# Altium footprint library OSHW_LuxonisMaster_20201223.PcbLib: 112 footprints (part 1 of 7)
Each footprint in its own frame and in the unit in brackets; x right, y up, seen from the top. Pads: shape width x height; smd on the part's side, far side on the other; paste and mask are expansions set on the pad; w line width, h text height; cw(c..) or ccw(c..) is an arc to the next point about the centre after c.
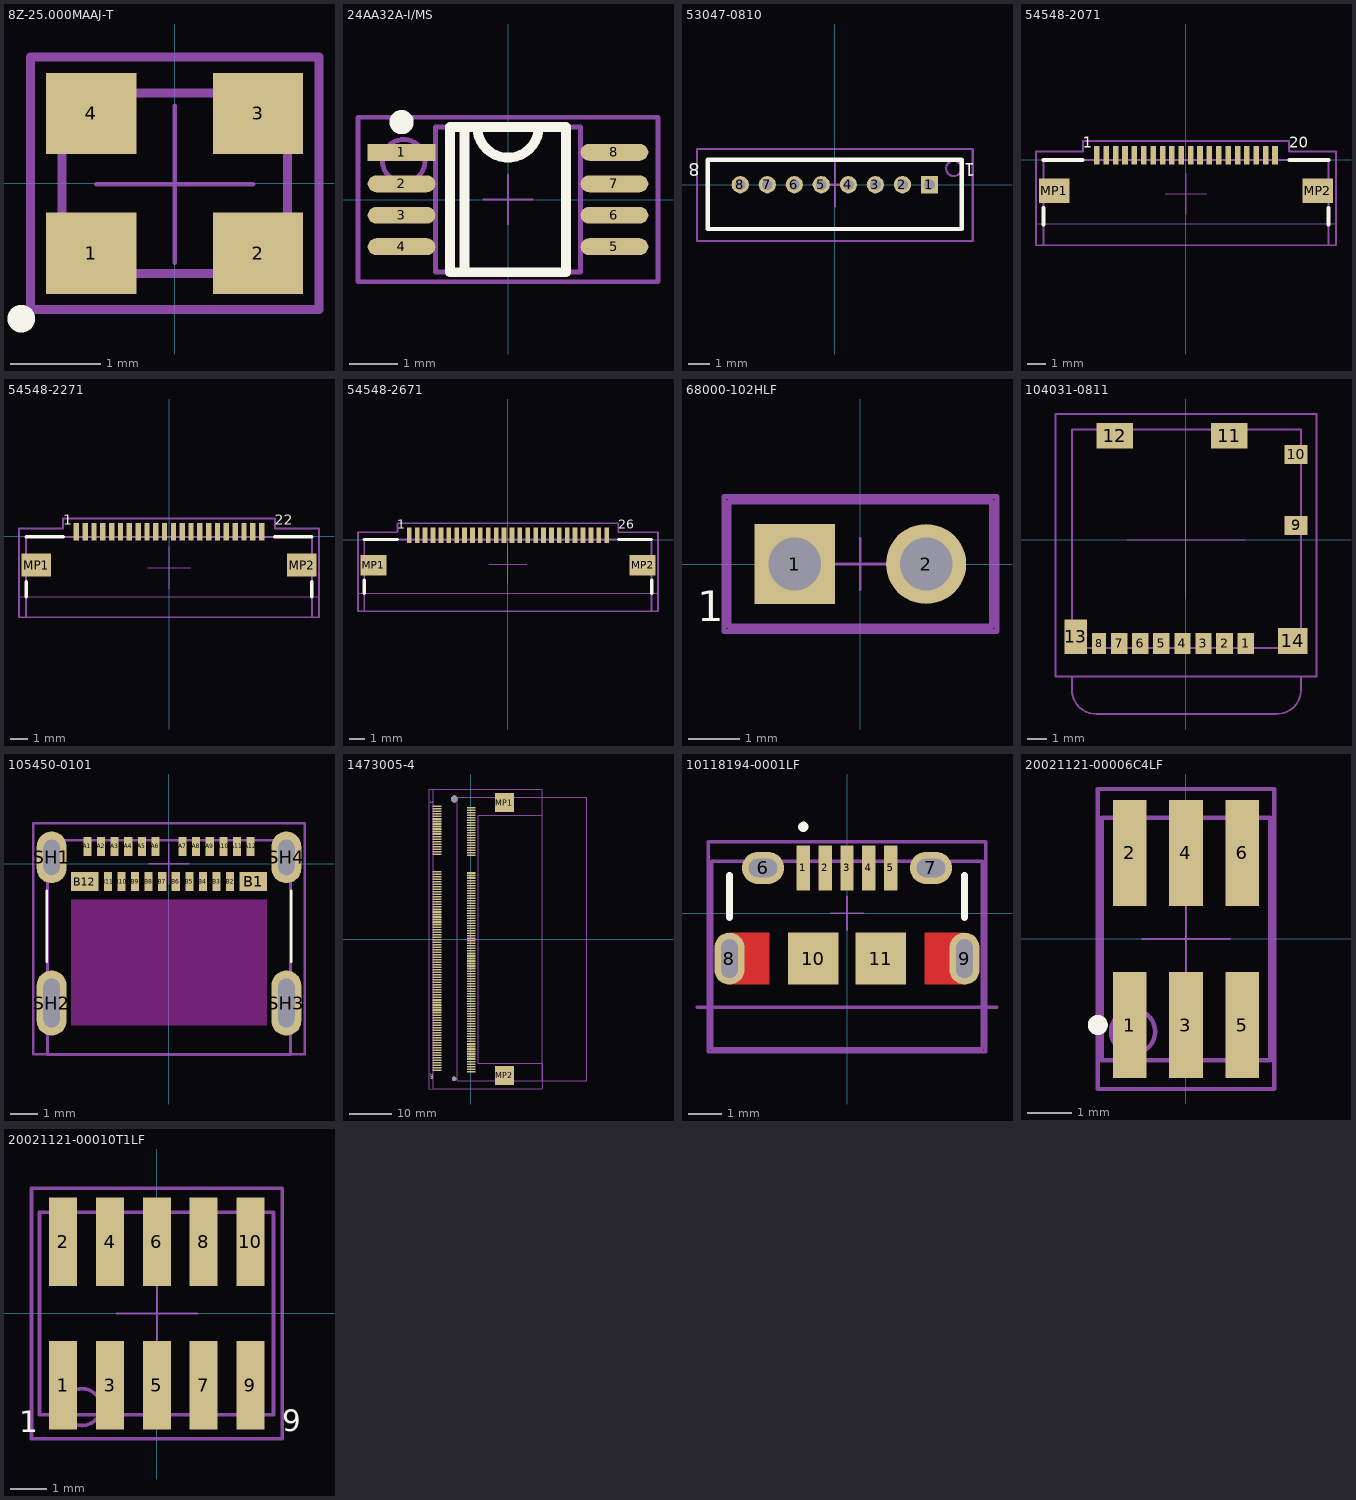
[diagram p0: the footprints below, top view; thin cyan lines are the x and y axes]

## 8Z-25.000MAAJ-T [mm] "2.5 x 2.0 x 0.5mm 8Z series XTAL"
height 0.55
pads (4):
  rect 1x0.9 smd: 1(-0.925,-0.775) 2(0.925,-0.775) 3(0.925,0.775) 4(-0.925,0.775)
Top Overlay:
  circle w0.254: c-1.7,-1.5 r0.025
Top Assembly:
  lines w0.1: -1.6,-1.4 1.6,-1.4 1.6,1.4 -1.6,1.4 -1.6,-1.4
  text "'.Designator'" at 0,-0.011 h1
Top Courtyard:
  lines w0.05: -0.87,-0.011 0,-0.011 ; 0,-0.881 0,-0.011 ; 0,0.859 0,-0.011 ; 0.87,-0.011 0,-0.011 ; -1.6,-1.4 1.6,-1.4 1.6,1.4 -1.6,1.4 -1.6,-1.4
Top Component Outline:
  lines w0.1: -1.25,-1 -1.25,1 1.25,1 1.25,-1 -1.25,-1
3D body: height 0.55, standoff 0, extent -1.25,-1 1.25,1

## 24AA32A-I/MS [mm] "Body: 3 x 3mm, pitch: 0.65mm"
pads (8):
  rect 1.4x0.35 smd mask+0.05: 1(-2.2,0.975)
  oval 1.4x0.35 smd mask+0.05: 2(-2.2,0.325) 3(-2.2,-0.325) 4(-2.2,-0.975) 5(2.2,-0.975) 6(2.2,-0.325) 7(2.2,0.325) 8(2.2,0.975)
Top Overlay:
  circle w0.25: c-2.2,1.6 r0.125
  lines w0.2: -0.9,-1.5 -0.9,1.5 ; -0.635,1.5 ccw(c0,1.5) 0.635,1.5 ; -1.2,-1.5 -1.2,1.5 1.2,1.5 1.2,-1.5 -1.2,-1.5
Top Assembly:
  circle w0.1: c-2.154,0.8 r0.441
  lines w0.1: -3.1,-1.7 -3.1,1.7 -1.7,1.7 1.7,1.7 3.1,1.7 3.1,-1.7 1.7,-1.7 -1.7,-1.7 -3.1,-1.7
  text "'.Designator'" at 0,0 h1
Top Courtyard:
  lines w0.05: -0.5,0 0.5,0 ; 0,-0.5 0,0.5 ; -3.1,-1.7 -3.1,1.7 -1.7,1.7 1.7,1.7 3.1,1.7 3.1,-1.7 1.7,-1.7 -1.7,-1.7 -3.1,-1.7
Top Component Outline:
  lines w0.1: -1.5,-1.5 -1.5,1.5 1.5,1.5 1.5,-1.5 -1.5,-1.5
3D body "User Library-msop-8.step": height 1.15, standoff 0, extent -2.45,-1.5 2.45,1.5

## 15134-0802 [mm] "Cable Assembly, Single Row, 150.00mm Length, 8 Circuits"
height 5.2

## 53047-0810 [mm] "1.25mm Pitch, PicoBlade PCB Header, Single Row, Vertical, Through Hole, Tin Plating, Friction Lock, 8 Circuits"
height 0.132
pads (8):
  rect 0.8x0.8 hole 0.5: 1(4.375,0)
  round 0.8 hole 0.5: 2(3.125,0) 3(1.875,0) 4(0.625,0) 5(-0.625,0) 6(-1.875,0) 7(-3.125,0) 8(-4.375,0)
Top Overlay:
  lines w0.2: 5.875,1.15 5.875,-2.05 -5.875,-2.05 -5.875,1.15 5.875,1.15 ; 5.875,1.15 5.875,1.15
  text "8" at -6.25,1.2 h1
  text "1" at 6.5,1.2 h1
Top Assembly:
  circle w0.1: c5.5,0.75 r0.354
  lines w0.1: -6.375,-2.6 -6.375,1.65 6.375,1.65 6.375,-2.6 -6.375,-2.6
  text "'.Designator'" at 0,0 h1
Top Courtyard:
  lines w0.05: -6.375,-2.6 6.375,-2.6 6.375,1.65 -6.375,1.65 -6.375,-2.6
  lines w0.1: -1,0 0,0 ; 0,-1 0,0 ; 0,1 0,0 ; 1,0 0,0
Top Component Outline:
  lines w0.1: -5.875,-2.05 -5.875,1.15 5.875,1.15 5.875,-2.05 -5.875,-2.05
3D body "PicoBladePTH_8p_Header_530470810.stp": height 4.18, standoff -2.32, extent -5.875,-2.05 5.875,1.15

## 54548-2071 [mm] "20pin Molex FFC 0.5mm"
height 1.3
pads (22):
  rect 0.3x1 smd: 1(-4.75,0.25) 2(-4.25,0.25) 3(-3.75,0.25) 4(-3.25,0.25) 5(-2.75,0.25) 6(-2.25,0.25) 7(-1.75,0.25) 8(-1.25,0.25) 9(-0.75,0.25) 10(-0.25,0.25) 11(0.25,0.25) 12(0.75,0.25) 13(1.25,0.25) 14(1.75,0.25) 15(2.25,0.25) 16(2.75,0.25) 17(3.25,0.25) 18(3.75,0.25) 19(4.25,0.25) 20(4.75,0.25)
  rect 1.65x1.3 smd: MP1(-7.025,-1.65) MP2(7.025,-1.65)
Top Overlay:
  lines w0.2: -7.6,-3.45 -7.6,-2.562 ; -7.6,0 -5.5,0 ; 5.5,0 7.6,0 ; 7.6,-3.45 7.6,-2.562
  text "20" at 5.5,0.45 h1
  text "1" at -5.5,0.45 h1
Top Assembly:
  lines w0.1: 8,-1.55 8,0.45 5.5,0.45 5.5,1 -5.5,1 -5.5,0.45 -8,0.45 -8,-2.3 -8,-4.55 8,-4.55 ; 8,-1 8,-4.55 ; 8,-4.55 8,-4.55
  text "'.Designator'" at 0,0 h1
Top Courtyard:
  lines w0.05: -8,-3.4 8,-3.4 ; -1.1,-1.8 0,-1.8 ; 0,-2.9 0,-1.8 ; 0,-0.7 0,-1.8 ; 1.1,-1.8 0,-1.8 ; 8,-1.55 8,0.45 5.5,0.45 5.5,1 -5.5,1 -5.5,0.45 -8,0.45 -8,-2.3 -8,-4.55 8,-4.55 8,-1
Top Component Outline:
  lines w0.1: -7.6,-4.55 -7.6,0 7.6,0 7.6,-4.55 -7.6,-4.55
3D body "545482071.stp": height 1.18, standoff -0.02, extent -7.6,-4.55 7.6,0.45

## 54548-2271 [mm] "22pin Molex FFC 0.5mm"
height 1.3
pads (24):
  rect 0.3x1 smd: 1(-5.25,0.269) 2(-4.75,0.269) 3(-4.25,0.269) 4(-3.75,0.269) 5(-3.25,0.269) 6(-2.75,0.269) 7(-2.25,0.269) 8(-1.75,0.269) 9(-1.25,0.269) 10(-0.75,0.269) 11(-0.25,0.269) 12(0.25,0.269) 13(0.75,0.269) 14(1.25,0.269) 15(1.75,0.269) 16(2.25,0.269) 17(2.75,0.269) 18(3.25,0.269) 19(3.75,0.269) 20(4.25,0.269) 21(4.75,0.269) 22(5.25,0.269)
  rect 1.65x1.3 smd: MP1(-7.525,-1.631) MP2(7.525,-1.631)
Top Overlay:
  lines w0.2: -8.1,-3.431 -8.1,-2.571 ; -8.1,-0.031 -6,-0.031 ; 6,-0.031 8.1,-0.031 ; 8.1,-3.431 8.1,-2.571
  text "1" at -6,0.45 h1
  text "22" at 6,0.45 h1
Top Assembly:
  lines w0.1: -8.5,-4.581 -8.5,0.45 -6,0.45 -6,1.019 6,1.019 6,0.45 8.5,0.45 8.5,-4.581 -8.5,-4.581
  text "'.Designator'" at 0,-0.031 h1
Top Courtyard:
  lines w0.05: -8.5,-3.431 8.5,-3.431 ; -1.2,-1.781 0,-1.781 ; 0,-2.981 0,-1.781 ; 0,-0.581 0,-1.781 ; 1.2,-1.781 0,-1.781 ; -8.5,-4.581 -8.5,0.45 -6,0.45 -6,1.019 6,1.019 6,0.45 8.5,0.45 8.5,-4.581 -8.5,-4.581
Top Component Outline:
  lines w0.1: -8.1,-4.581 -8.1,-0.031 8.1,-0.031 8.1,-4.581 -8.1,-4.581
3D body "54548-2271.stp": height 1.18, standoff -0.02, extent -8.1,-4.55 8.1,0.45

## 54548-2671 [mm] "26pin Molex FFC 0.5mm"
height 1.3
pads (28):
  rect 0.3x1 smd: 1(-6.241,0.272) 2(-5.741,0.272) 3(-5.241,0.272) 4(-4.741,0.272) 5(-4.241,0.272) 6(-3.741,0.272) 7(-3.241,0.272) 8(-2.741,0.272) 9(-2.241,0.272) 10(-1.741,0.272) 11(-1.241,0.272) 12(-0.741,0.272) 13(-0.241,0.272) 14(0.259,0.272) 15(0.759,0.272) 16(1.259,0.272) 17(1.759,0.272) 18(2.259,0.272) 19(2.759,0.272) 20(3.259,0.272) 21(3.759,0.272) 22(4.259,0.272) 23(4.759,0.272) 24(5.259,0.272) 25(5.759,0.272) 26(6.259,0.272)
  rect 1.65x1.3 smd: MP1(-8.516,-1.628) MP2(8.534,-1.628)
Top Overlay:
  lines w0.2: -9.091,-3.428 -9.091,-2.568 ; -9.091,0 -6.991,0 ; 6.998,0 9.098,0 ; 9.109,-3.428 9.109,-2.568
  text "1" at -6.991,0.45 h1
  text "26" at 6.998,0.45 h1
Top Assembly:
  lines w0.1: -9.491,-4.55 -9.491,0.45 -6.991,0.45 -6.991,1.022 6.998,1.022 6.998,0.45 9.509,0.45 9.509,-4.55 -9.491,-4.55
  text "'.Designator'" at 0.003,0 h1
Top Courtyard:
  lines w0.05: -9.491,-3.4 9.509,-3.4 ; -1.2,-1.578 0,-1.578 ; 0,-2.778 0,-1.578 ; 0,-0.378 0,-1.578 ; 1.2,-1.578 0,-1.578 ; -9.491,-4.55 -9.1,-4.55 9.509,-4.55 9.509,0.45 6.998,0.45 6.998,1.022 -6.991,1.022 -6.991,0.45 -9.491,0.45 -9.491,-4.34 -9.491,-4.55
Top Component Outline:
  lines w0.1: -9.1,-4.55 9.1,-4.55 9.098,-4.55 9.098,0 -9.092,0 -9.1,0 -9.1,-4.55
3D body "545482671.stp": height 1.18, standoff -0.02, extent -9.1,-4.55 9.1,0.45

## 68000-102HLF [mm] "THD, 2-Leads, Body 5.08x2.41mm, Pitch 2.54mm"
height 8.38
pads (2):
  rect 1.55x1.55 hole 1.02: 1(-1.27,0)
  round 1.55 hole 1.02: 2(1.27,0)
Top Overlay:
  text "1" at -3.16,-1.3 h1
Top Assembly:
  lines w0.1: -2.64,-1.305 2.64,-1.305 2.64,1.305 -2.64,1.305 -2.64,-1.305
  text "'.Designator'" at 0,0 h1
Top Courtyard:
  lines w0.05: -0.5,0 0.5,0 ; 0,-0.5 0,0.5 ; -2.64,-1.305 -2.64,1.305 2.64,1.305 2.64,-1.305 -2.64,-1.305
Top Component Outline:
  lines w0.1: -2.54,-1.205 2.54,-1.205 2.54,1.205 -2.54,1.205 -2.54,-1.205
3D body: height 2.54, standoff 0.2, extent -2.54,-1.205 2.54,1.205
3D body: height 8.38, standoff -2.41, extent -1.59,-0.32 -0.95,0.32
3D body: height 8.38, standoff -2.41, extent 0.95,-0.32 1.59,0.32

## 90592A006 [mm] "Steel Hex Nut  Low-Strength, M2.5 x 0.45 mm Thread"
height 2.35
3D body "90592A006_NO THREADS_STEEL HEX NUT.STEP": height 2.35, standoff -0.03, extent -2.5,-2.887 2.5,2.887

## 92000A102 [mm] "Passivated 18-8 Stainless Steel Pan Head Phillips Screws  M2.5 x 0.45mm Thread, 4mm Long"
height 6.1
3D body "92000A102_18-8 SS METRIC PAN HEAD PHIL MACHINE SCREW.STEP": height 2.03, standoff -4, extent -2.5,-2.5 2.5,2.5

## 104031-0811 [mm] "10 (8 + 2) Position Card Connector Secure Digital - microSD™ Surface Mount, Right Angle Gold"
height 1.42
pads (14):
  rect 0.85x1.1 smd: 1(3.113,-5.412) 3(0.913,-5.412) 4(-0.188,-5.412) 5(-1.288,-5.412) 6(-2.387,-5.412) 7(-3.487,-5.412)
  rect 0.875x1.1 smd: 2(2.013,-5.412)
  rect 0.75x1.1 smd: 8(-4.537,-5.412)
  rect 1.2x1 smd: 9(5.748,0.738) 10(5.748,4.438)
  rect 1.9x1.35 smd: 11(2.248,5.413) 12(-3.722,5.413)
  rect 1.17x1.8 smd: 13(-5.747,-5.062)
  rect 1.55x1.35 smd: 14(5.573,-5.287)
Top Assembly:
  lines w0.1: -5.95,-7.15 -5.95,-7.83 ccw(c-4.68,-7.83) -4.68,-9.1 -3.7,-9.1 4.73,-9.1 ccw(c4.73,-7.83) 6,-7.83 6,-7.15 ; -5.95,-7.15 -6.8,-7.15 -6.8,-6.75 -6.8,6.55 4.1,6.55 6.8,6.55 6.8,-5.412 6.8,-7.15 6,-7.15 ; -5.95,-7.15 6,-7.15
  text "'.Designator'" at 0,0 h1
Top Courtyard:
  lines w0.05: -3.1,0 0,0 ; 0,-3.1 0,0 ; 0,3.1 0,0 ; 3.1,0 0,0 ; -6.8,-7.15 -6.8,6.55 6.8,6.55 6.8,-7.15 -6.8,-7.15
Top Component Outline:
  lines w0.1: -5.95,-5.65 6,-5.65 6,5.75 -5.95,5.75 -5.95,-5.65
3D body "1040310811.stp": height 1.44, standoff -0.01, extent -5.95,-5.65 6,5.75

## 105450-0101 [mm] "USB3.1 Type-C Molex SMT, RA, TH"
pads (28):
  rect 0.3x0.7 smd mask+0.05: A1(-3,0.65) A2(-2.5,0.65) A3(-2,0.65) A4(-1.5,0.65) A5(-1,0.65) A6(-0.5,0.65) A7(0.5,0.65) A8(1,0.65) A9(1.5,0.65) A10(2,0.65) A11(2.5,0.65) A12(3,0.65) B2(2.25,-0.65) B3(1.75,-0.65) B4(1.25,-0.65) B5(0.75,-0.65) B6(0.25,-0.65) B7(-0.25,-0.65) B8(-0.75,-0.65) B9(-1.25,-0.65) B10(-1.75,-0.65) B11(-2.25,-0.65)
  rect 1x0.7 smd mask+0.05: B1(3.1,-0.65) B12(-3.1,-0.65)
  oval 1.1x1.9 hole 0.6 slot 1.3 at 90 deg mask+0.05: SH1(-4.32,0.24) SH4(4.32,0.24)
  oval 1.1x2.4 hole 0.6 slot 1.8 at 90 deg mask+0.05: SH2(-4.32,-5.12) SH3(4.32,-5.12)
Top Layer keep-out:
  rectangle: -3.6,-5.95 3.6,-1.3
Top Overlay:
  lines w0.1: -4.5,-3.6 -4.5,-1 ; 4.5,-3.6 4.5,-1
Top Assembly:
  lines w0.1: -5,-7 5,-7 5,1.5 -5,1.5 -5,-7
  text "'.Designator'" at 0,0 h1
Top Courtyard:
  lines w0.05: -0.75,0 0,0 ; 0,-0.75 0,0 ; 0,0.75 0,0 ; 0.75,0 0,0 ; -5,-7 -5,1.5 5,1.5 5,-7 -5,-7
Top Component Outline:
  lines w0.1: -4.47,-7.025 4.47,-7.025 4.47,0.875 -4.47,0.875 -4.47,-7.025
3D body "1054500101.stp": height 3.2, standoff -0.76, extent -4.47,-7.025 4.47,0.875

## 1473005-4 [mm] "DDR2 SODIMM SOCKET 200P 5"
height 5.2
pads (204):
  rect 2.05x0.38 smd: 1(-8.05,31.65) 1(-8.05,31.65) 2(0.15,31.35) 2(0.15,31.35) 3(-8.05,31.05) 4(0.15,30.75) 5(-8.05,30.45) 6(0.15,30.15) 7(-8.05,29.85) 8(0.15,29.55) 9(-8.05,29.25) 10(0.15,28.95) 11(-8.05,28.65) 12(0.15,28.35) 13(-8.05,28.05) 14(0.15,27.75) 15(-8.05,27.45) 16(0.15,27.15) 17(-8.05,26.85) 18(0.15,26.55) 19(-8.05,26.25) 20(0.15,25.95) 21(-8.05,25.65) 22(0.15,25.35) 23(-8.05,25.05) 24(0.15,24.75) 25(-8.05,24.45) 26(0.15,24.15) 27(-8.05,23.85) 28(0.15,23.55) 29(-8.05,23.25) 30(0.15,22.95) 31(-8.05,22.65) 32(0.15,22.35) 33(-8.05,22.05) 34(0.15,21.75) 35(-8.05,21.45) 36(0.15,21.15) 37(-8.05,20.85) 38(0.15,20.55) 39(-8.05,20.25) 40(0.15,19.95) 41(-8.05,16.05) 42(0.15,15.75) 43(-8.05,15.45) 44(0.15,15.15) 45(-8.05,14.85) 46(0.15,14.55) 47(-8.05,14.25) 48(0.15,13.95) 49(-8.05,13.65) 50(0.15,13.35) 51(-8.05,13.05) 52(0.15,12.75) 53(-8.05,12.45) 54(0.15,12.15) 55(-8.05,11.85) 56(0.15,11.55) 57(-8.05,11.25) 58(0.15,10.95) 59(-8.05,10.65) 60(0.15,10.35) 61(-8.05,10.05) 62(0.15,9.75) 63(-8.05,9.45) 64(0.15,9.15) 65(-8.05,8.85) 66(0.15,8.55) 67(-8.05,8.25) 68(0.15,7.95) 69(-8.05,7.65) 70(0.15,7.35) 71(-8.05,7.05) 72(0.15,6.75) 73(-8.05,6.45) 74(0.15,6.15) 75(-8.05,5.85) 76(0.15,5.55) 77(-8.05,5.25) 78(0.15,4.95) 79(-8.05,4.65) 80(0.15,4.35) 81(-8.05,4.05) 82(0.15,3.75) 83(-8.05,3.45) 84(0.15,3.15) 85(-8.05,2.85) 86(0.15,2.55) 87(-8.05,2.25) 88(0.15,1.95) 89(-8.05,1.65) 90(0.15,1.35) 91(-8.05,1.05) 92(0.15,0.75) 93(-8.05,0.45) 94(0.15,0.15) 95(-8.05,-0.15) 96(0.15,-0.45) 97(-8.05,-0.75) 98(0.15,-1.05) 99(-8.05,-1.35) 100(0.15,-1.65) 101(-8.05,-1.95) 102(0.15,-2.25) 103(-8.05,-2.55) 104(0.15,-2.85) 105(-8.05,-3.15) 106(0.15,-3.45) 107(-8.05,-3.75) 108(0.15,-4.05) 109(-8.05,-4.35) 110(0.15,-4.65) 111(-8.05,-4.95) 112(0.15,-5.25) 113(-8.05,-5.55) 114(0.15,-5.85) 115(-8.05,-6.15) 116(0.15,-6.45) 117(-8.05,-6.75) 118(0.15,-7.05) 119(-8.05,-7.35) 120(0.15,-7.65) 121(-8.05,-7.95) 122(0.15,-8.25) 123(-8.05,-8.55) 124(0.15,-8.85) 125(-8.05,-9.15) 126(0.15,-9.45) 127(-8.05,-9.75) 128(0.15,-10.05) 129(-8.05,-10.35) 130(0.15,-10.65) 131(-8.05,-10.95) 132(0.15,-11.25) 133(-8.05,-11.55) 134(0.15,-11.85) 135(-8.05,-12.15) 136(0.15,-12.45) 137(-8.05,-12.75) 138(0.15,-13.05) 139(-8.05,-13.35) 140(0.15,-13.65) 141(-8.05,-13.95) 142(0.15,-14.25) 143(-8.05,-14.55) 144(0.15,-14.85) 145(-8.05,-15.15) 146(0.15,-15.45) 147(-8.05,-15.75) 148(0.15,-16.05) 149(-8.05,-16.35) 150(0.15,-16.65) 151(-8.05,-16.95) 152(0.15,-17.25) 153(-8.05,-17.55) 154(0.15,-17.85) 155(-8.05,-18.15) 156(0.15,-18.45) 157(-8.05,-18.75) 158(0.15,-19.05) 159(-8.05,-19.35) 160(0.15,-19.65) 161(-8.05,-19.95) 162(0.15,-20.25) 163(-8.05,-20.55) 164(0.15,-20.85) 165(-8.05,-21.15) 166(0.15,-21.45) 167(-8.05,-21.75) 168(0.15,-22.05) 169(-8.05,-22.35) 170(0.15,-22.65) 171(-8.05,-22.95) 172(0.15,-23.25) 173(-8.05,-23.55) 174(0.15,-23.85) 175(-8.05,-24.15) 176(0.15,-24.45) 177(-8.05,-24.75) 178(0.15,-25.05) 179(-8.05,-25.35) 180(0.15,-25.65) 181(-8.05,-25.95) 182(0.15,-26.25) 183(-8.05,-26.55) 184(0.15,-26.85) 185(-8.05,-27.15) 186(0.15,-27.45) 187(-8.05,-27.75) 188(0.15,-28.05) 189(-8.05,-28.35) 190(0.15,-28.65) 191(-8.05,-28.95) 192(0.15,-29.25) 193(-8.05,-29.55) 194(0.15,-29.85) 195(-8.05,-30.15) 196(0.15,-30.45) 197(-8.05,-30.75) 198(0.15,-31.05) 199(-8.05,-31.35) 200(0.15,-31.65)
  rect 4.6x4.5 smd: MP1(8.05,32.55) MP2(8.05,-32.55)
via -3.95,-33.4 diameter 1.1 hole 1.1
via -3.95,33.4 diameter 1.6 hole 1.6
Top Overlay:
  text "199" at -9.795,-32.092 h1
  text "1" at -9.812,32.884 h1
Board:
  region: -1.75,33.4
Top Assembly:
  lines w0.1: -9.95,35.8 -9.95,-35.8 17.1,-35.75 17.1,-33.8 ; -9.95,35.801 17.1,35.75 ; -8.95,35.75 17.1,35.75 ; 1.75,29.55 1.75,-29.6 17.1,-29.6 ; 1.75,29.55 1.75,29.55 ; 1.75,29.55 17.1,29.55 17.1,33.8 17.1,33.8 ; 17.1,-29.6 17.1,-29.6 17.1,-33.8 ; 17.1,-29.6 17.1,-29.6 ; 17.1,-33.8 27.75,-33.8 27.75,33.8 17.1,33.8 ; 17.1,33.8 17.1,35.75
  text "'.Designator'" at -0.032,-0.04 h1
Top Courtyard:
  lines w0.05: 0,-1.5 0,0 ; 0,1.6 0,0 ; 1.5,0 0,0 ; 17.1,-33.8 27.75,-33.8 27.75,33.8 17.1,33.8 ; 0,0 -1.6,0 0,0 ; -9.95,-35.801 17.1,-35.75 17.1,-29.6 1.75,-29.6 1.75,29.55 17.1,29.55 17.1,35.75 -9.95,35.801 -9.95,-35.801
  text "<1mm height" at 15.2,4.9 h1
Top Component Outline:
  lines w0.1: 17.1,-33.8 27.75,-33.8 27.75,33.8 17.1,33.8 ; 17.1,-33.8 17.1,33.8 ; 17.1,-33.8 -3.25,-33.8 -3.25,33.8 17.1,33.8 ; 17.1,-33.8 17.1,-35.75 -8.95,-35.75 -8.95,35.75 17.1,35.75 17.1,33.8
3D body "c-1473005-4-j1-3d.stp": height 5.2, standoff -0.7, extent -8.95,-35.75 17.1,35.75
3D body "Compute Module.stp": height 4.8, standoff 2.2, extent -3.25,-33.8 27.75,33.8

## 10118194-0001LF [mm] "FCI-10118194-0001LF-5_V SMD, 5-Leads, Body 7x5mm, Pitch 0.65 mm"
height 2.673
pads (11):
  rect 0.4x1.35 smd: 1(-1.3,1.35) 2(-0.65,1.35) 3(0,1.35) 4(0.65,1.35) 5(1.3,1.35)
  oval 1.25x0.95 hole 0.55 slot 0.85 at 0 deg: 6(-2.5,1.35) 7(2.5,1.35)
  oval 0.9x1.55 hole 0.5 slot 1.15 at 90 deg: 8(-3.5,-1.35) 9(3.5,-1.35)
  rect 1.5x1.55 smd: 10(-1,-1.35) 11(1,-1.35)
Top Layer:
  region: 3.5,-2.125 3.5,-0.575 2.3,-0.575 2.3,-2.125
  region: -2.3,-2.125 -2.3,-0.575 -3.5,-0.575 -3.5,-2.125
Top Overlay:
  circle w0.254: c-1.3,2.575 r0.025
  lines w0.2: -3.5,-0.125 -3.5,1.13 ; 3.5,-0.125 3.5,1.13
Top Assembly:
  lines w0.1: -4.465,-2.8 0,-2.8 4.465,-2.8 ; -4.125,-4.13 -4.125,2.125 4.125,2.125 4.125,-4.13 -4.125,-4.13
  text "PCB EDGE" at -7.2,-2.9 h0.3
  text "'.Designator'" at 0,0 h1
Top Courtyard:
  lines w0.05: -0.5,0 0.5,0 ; 0,-0.5 0,0.5 ; -4.125,-4.13 4.125,-4.13 4.125,2.125 -4.125,2.125 -4.125,-4.13
Top Component Outline:
  lines w0.1: -4.025,-4.03 4.025,-4.03 4.025,1.55 -4.025,1.55 -4.025,-4.03
3D body "10118194c.stp": height 2.72, standoff -0.55, extent -4.025,-4.03 4.025,1.55

## 20021121-00006C4LF [mm] "Connector Header Surface Mount 6 position 0.050\" (1.27mm)"
height 4
pads (6):
  rect 0.76x2.4 smd: 1(-1.27,-1.95) 2(-1.27,1.95) 3(0,-1.95) 4(0,1.95) 5(1.27,-1.95) 6(1.27,1.95)
Top Overlay:
  circle w0.254: c-2,-1.95 r0.1
Top Assembly:
  lines w0.1: -0.7,-2.1 cw(c-1.2,-2.1) -0.7,-2.1 ; -2,-3.4 2,-3.4 2,3.4 -2,3.4 -2,-3.4
  text "'.Designator'" at 0,0 h1
Top Courtyard:
  lines w0.05: -1,0 0,0 ; 0,-1 0,0 ; 0,1 0,0 ; 1,0 0,0 ; -2,-3.4 -2,3.4 2,3.4 2,-3.4 -2,-3.4
Top Component Outline:
  lines w0.1: -1.905,-2.75 -1.905,2.75 1.905,2.75 1.905,-2.75 -1.9,-2.75 -1.905,-2.75
3D body "20960.stp": height 4.5, standoff 0, extent -1.905,-2.75 1.905,2.75

## 20021121-00010T1LF [mm] "Connector Header Surface Mount 10 position 0.050\" (1.27mm)   Contact length: 0.120\" (3.05mm)"
height 4
pads (10):
  rect 0.76x2.4 smd: 1(-2.54,-1.95) 2(-2.54,1.95) 3(-1.27,-1.95) 4(-1.27,1.95) 5(0,-1.95) 6(0,1.95) 7(1.27,-1.95) 8(1.27,1.95) 9(2.54,-1.95) 10(2.54,1.95)
Top Overlay:
  text "1" at -3.737,-3.429 h1
  text "9" at 3.4,-3.4 h1
Top Assembly:
  lines w0.1: -3.4,-3.4 3.4,-3.4 3.4,3.4 -3.4,3.4 -3.4,-3.4 ; -1.524,-2.54 ccw(c-2.024,-2.54) -1.524,-2.54
  text "'.Designator'" at 0,0 h1
Top Courtyard:
  lines w0.05: -1.1,0 0,0 ; 0,-1.1 0,0 ; 0,1.1 0,0 ; 1.1,0 0,0 ; -3.4,-3.4 -3.4,3.4 3.4,3.4 3.4,-3.4 -3.4,-3.4
Top Component Outline:
  lines w0.1: -3.184,-2.75 -3.184,2.75 3.166,2.75 3.166,-2.75 -3.184,-2.75
3D body "20021121-00010T1LF.stp": height 4.55, standoff 0, extent -3.184,-2.75 3.166,2.75